# Altium footprint library JL_PCB.PCBLIB: 1112 footprints (part 46 of 71)
Each footprint in its own frame and in the unit in brackets; x right, y up, seen from the top. Pads: shape width x height; smd on the part's side, far side on the other; paste and mask are expansions set on the pad; w line width, h text height; cw(c..) or ccw(c..) is an arc to the next point about the centre after c.
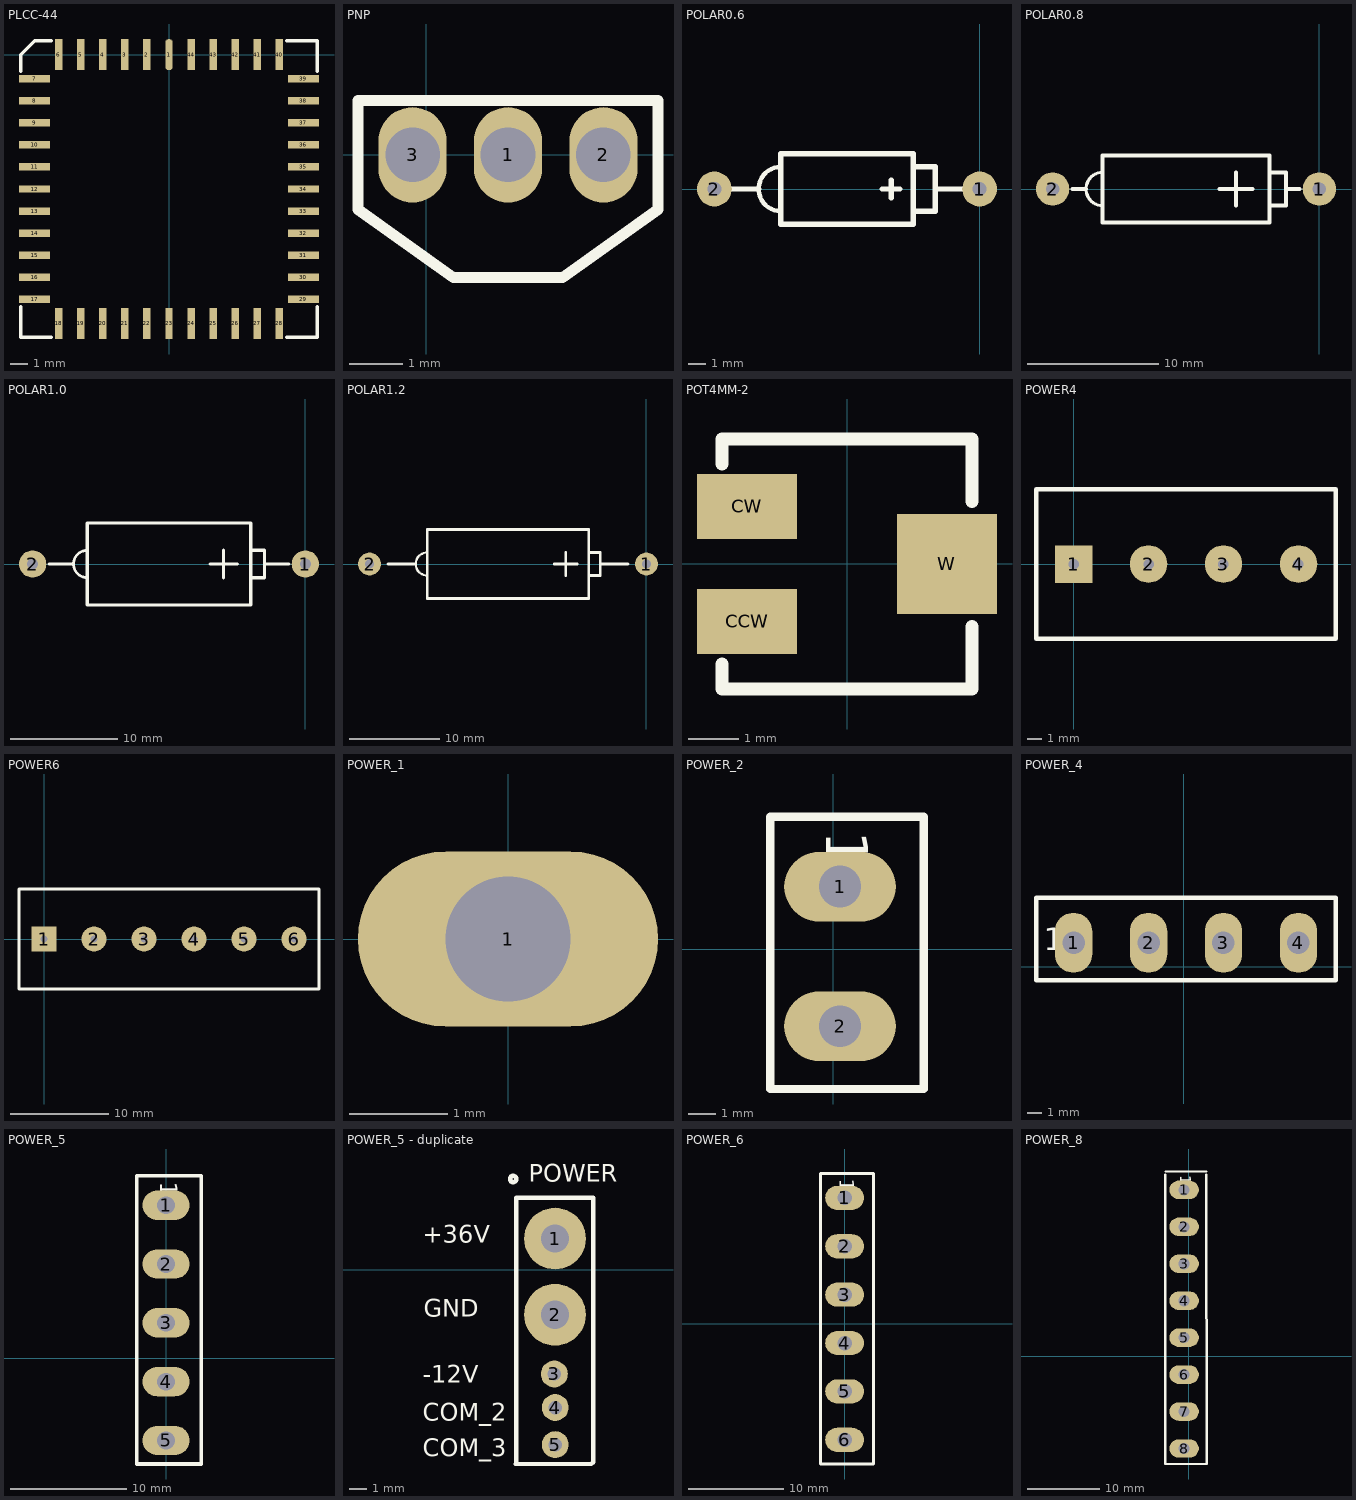
[diagram p45: the footprints below, top view; thin cyan lines are the x and y axes]

## PLCC-44 [mil]
pads (44):
  oval 17.01x70.87 smd: 1(0,0)
  rect 17.01x70.87 smd: 2(-50,0) 3(-100,0) 4(-150,0) 5(-200,0) 6(-250,0) 18(-250,-610) 19(-200,-610) 20(-150,-610) 21(-100,-610) 22(-50,-610) 23(0,-610) 24(50,-610) 25(100,-610) 26(150,-610) 27(200,-610) 28(250,-610) 40(250,0) 41(200,0) 42(150,0) 43(100,0) 44(50,0)
  rect 70.87x17.01 smd: 7(-305,-55) 8(-305,-105) 9(-305,-155) 10(-305,-205) 11(-305,-255) 12(-305,-305) 13(-305,-355) 14(-305,-405) 15(-305,-455) 16(-305,-505) 17(-305,-555) 29(305,-555) 30(305,-505) 31(305,-455) 32(305,-405) 33(305,-355) 34(305,-305) 35(305,-255) 36(305,-205) 37(305,-155) 38(305,-105) 39(305,-55)
TopOverlay:
  lines w7.87: -336.5,-572.01 -336.5,-641.5 -267.01,-641.5 ; -336.5,-37.99 -336.5,0 -305,31.5 -267.01,31.5 ; 267.01,-641.5 336.5,-641.5 336.5,-572.01 ; 267.01,31.5 336.5,31.5 336.5,-37.99

## PNP [mil]
pads (3):
  oval 50x70 hole 40: 1(60,0) 2(130,0) 3(-10,0)
TopOverlay:
  lines w8: -50,-40 20,-90 100,-90 170,-40 170,40 -50,40 -50,-40

## POLAR0.6 [mm]
pads (2):
  round 2 hole 0.813: 1(0,0) 2(-15.24,0)
TopOverlay:
  lines w0.254: -11.43,-1.27 cw(c-11.43,0) -11.43,1.27
  lines w0.305: -14.224,0 -12.7,0 ; -5.588,0 -4.572,0 ; -5.08,-0.508 -5.08,0.508 ; -3.81,-1.27 -2.54,-1.27 -2.54,1.27 -3.81,1.27 ; -2.54,0 -1.016,0 ; -11.43,-2.032 -3.81,-2.032 -3.81,2.032 -11.43,2.032 -11.43,-2.032

## POLAR0.8 [mil]
pads (2):
  round 100 hole 40: 1(0,0) 2(-800,0)
TopOverlay:
  lines w10: -650,-50 cw(c-650,0) -650,50
  lines w12: -740,0 -700,0 ; -300,0 -200,0 ; -250,-50 -250,50 ; -150,-50 -100,-50 -100,50 -150,50 ; -100,0 -60,0 ; -650,-100 -150,-100 -150,100 -650,100 -650,-100

## POLAR1.0 [mil]
pads (2):
  round 100 hole 40: 1(0,0) 2(-1000,0)
TopOverlay:
  lines w10: -800,-50 cw(c-800,0) -800,50
  lines w12: -940,0 -850,0 ; -350,0 -250,0 ; -300,-50 -300,50 ; -200,-50 -150,-50 -150,50 -200,50 ; -150,0 -60,0 ; -800,-150 -800,150 -200,150 -200,-150 -800,-150

## POLAR1.2 [mil]
pads (2):
  round 100 hole 40: 1(0,0) 2(-1200,0)
TopOverlay:
  lines w10: -950,-50 cw(c-950,0) -950,50
  lines w12: -1120,0 -1000,0 ; -400,0 -300,0 ; -350,-50 -350,50 ; -250,-50 -200,-50 -200,50 -250,50 ; -200,0 -80,0 ; -950,-150 -950,150 -250,150 -250,-150 -950,-150

## POT4MM-2 [mm] "Square Trimming Potentiometer"
pads (3):
  rect 2x1.3 smd: CCW(-2,-1.15) CW(-2,1.15)
  rect 2x2 smd: W(2,0)
TopOverlay:
  lines w0.254: -2.5,-2 -2.5,-2.5 2.5,-2.5 2.5,-1.25 ; -2.5,2 -2.5,2.5 2.5,2.5 2.5,1.25

## POWER4 [mil]
pads (4):
  rect 100x100 hole 28: 1(0,0)
  round 100 hole 28: 2(200,0) 3(400,0) 4(600,0)
TopOverlay:
  lines w12: -100,-200 700,-200 700,200 -100,200 -100,-200

## POWER6 [mil]
pads (6):
  rect 100x100 hole 28: 1(0,0)
  round 100 hole 28: 2(200,0) 3(400,0) 4(600,0) 5(800,0) 6(1000,0)
TopOverlay:
  lines w12: -100,-200 -100,200 1100,200 1100,-200 -100,-200

## POWER_1 [mil]
pads (1):
  oval 120x70 hole 50: 1(0,0)

## POWER_2 [mil]
pads (2):
  oval 160x100 hole 60: 1(10,90) 2(10,-110)
TopOverlay:
  lines w12: -90,-200 130,-200 130,190 -90,190 -90,-200
  text "1" at -10,170 h60

## POWER_4 [mil]
pads (4):
  oval 100x160 hole 60: 1(-294,64) 2(-94,64) 3(106,64) 4(306,64)
TopOverlay:
  lines w12: -394,-36 406,-36 406,184 -394,184 -394,-36
  text "1" at -374,44 h60

## POWER_5 [mil]
pads (5):
  oval 160x100 hole 60: 1(0,520) 2(0,320) 3(0,120) 4(0,-80) 5(0,-280)
TopOverlay:
  lines w12: -100,-360 120,-360 120,620 -100,620 -100,-360
  text "1" at -20,600 h60

## POWER_5 - duplicate [mil]
pads (5):
  round 137.79 hole 62.99: 1(730,70) 2(730,-100)
  round 60 hole 30: 3(728.39,-232.09) 4(730.35,-306.89) 5(730.35,-389.57)
TopOverlay:
  circle w10: c636.64,202.95 r7.1
  lines w10: 641.77,-432.87 811.06,-432.87 815,-428.94 815,161.61 643.74,161.61 643.74,-430.9 641.77,-432.87
  text "COM_3" at 435.08,-415.16 h39.37
  text "COM_2" at 435.08,-336.42 h39.37
  text "-12V" at 435.08,-251.77 h39.37
  text "GND" at 437.05,-104.13 h39.37
  text "+36V" at 435.08,61.22 h39.37
  text "POWER" at 671.3,197.05 h39.37

## POWER_6 [mil]
pads (6):
  oval 160x100 hole 60: 1(0,520) 2(0,320) 3(0,120) 4(0,-80) 5(0,-280) 6(0,-480)
TopOverlay:
  lines w12: -100,-580 -100,620 120,620 120,-580 -100,-580
  text "1" at -20,600 h60

## POWER_8 [mil]
pads (8):
  oval 160x100 hole 60: 1(-24,901.19) 2(-24,701.19) 3(-24,501.19) 4(-24,301.19) 5(-24,101.19) 6(-24,-98.81) 7(-24,-298.81) 8(-24,-498.81)
TopOverlay:
  lines w12: -125.98,984.25 -125.98,-582.68 98.42,-582.68 ; -124,1001.19 96,1001.19 ; 96,984.25 98.42,-578.74
  text "1" at -44,981.19 h60